# Altium footprint library Kapitoshka.PcbLib: 146 footprints (part 7 of 10)
Each footprint in its own frame and in the unit in brackets; x right, y up, seen from the top. Pads: shape width x height; smd on the part's side, far side on the other; paste and mask are expansions set on the pad; w line width, h text height; cw(c..) or ccw(c..) is an arc to the next point about the centre after c.
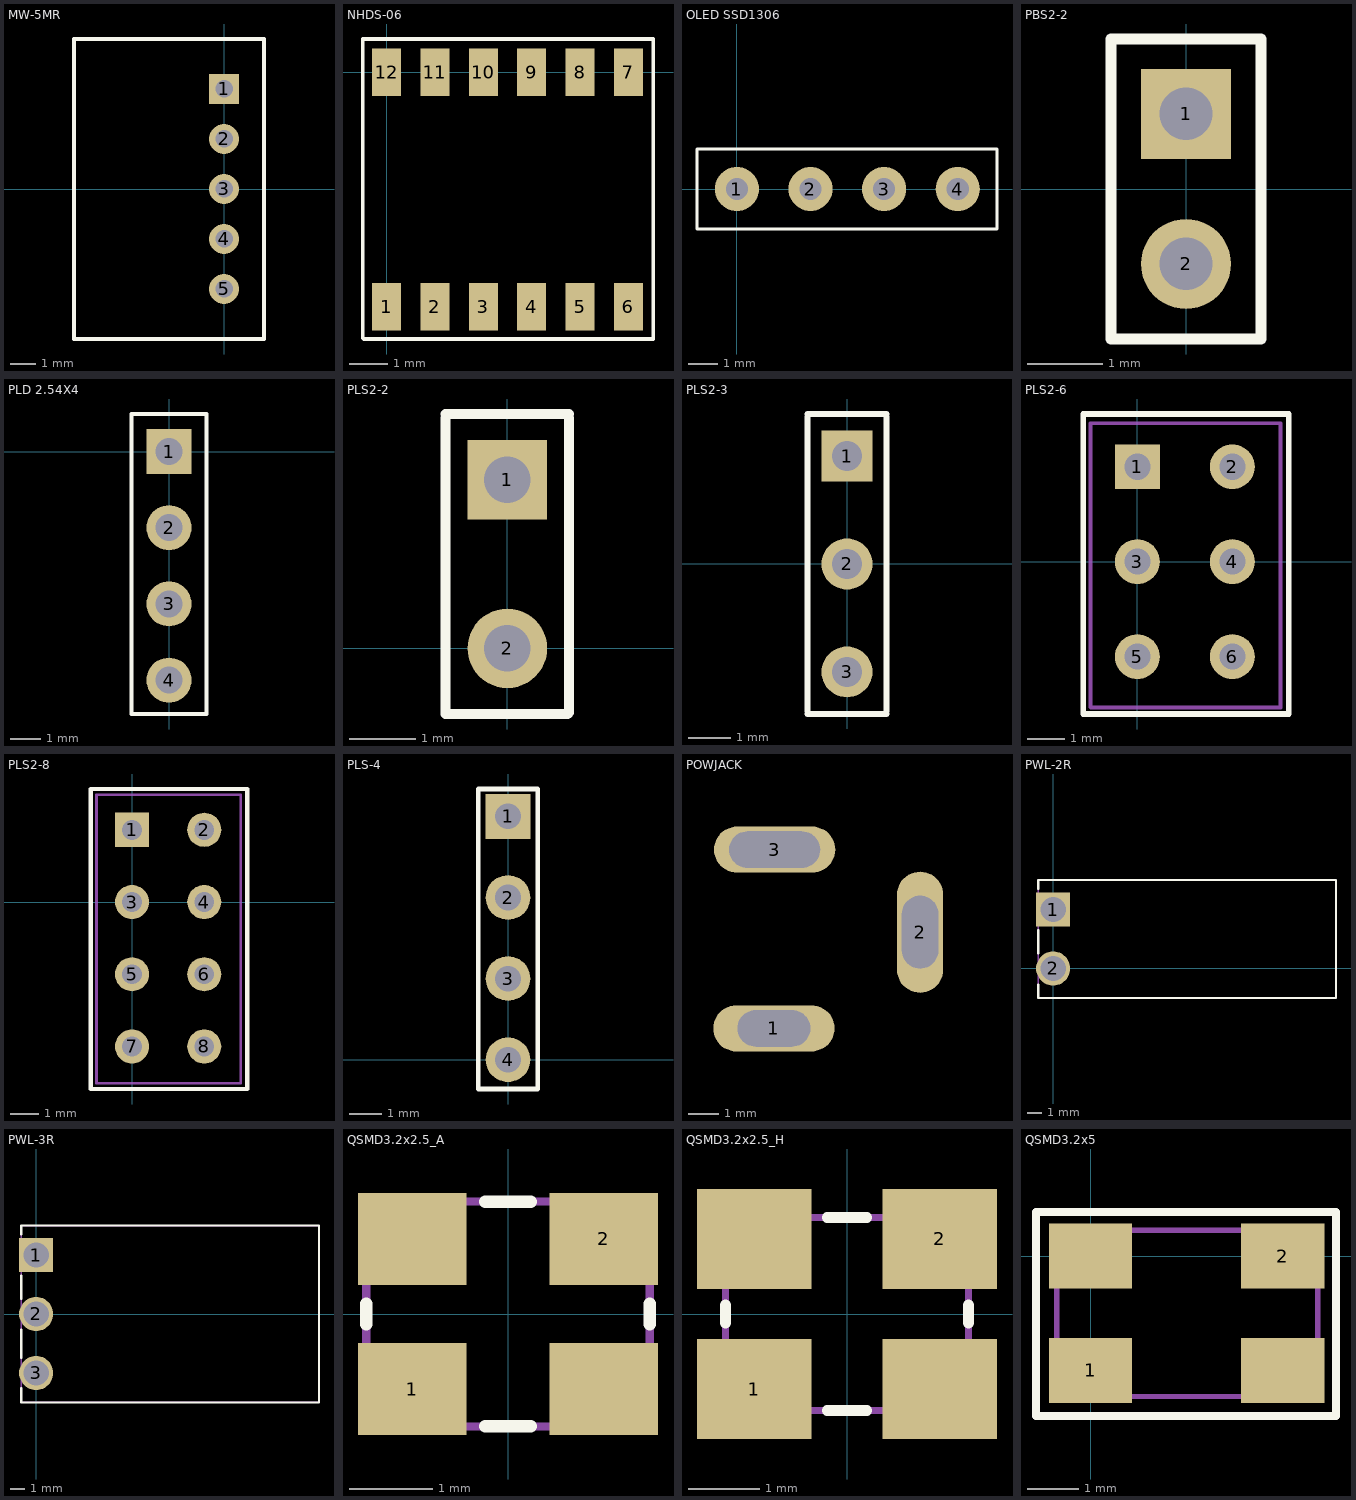
[diagram p6: the footprints below, top view; thin cyan lines are the x and y axes]

## MW-5MR [mm]
height 4.5
pads (5):
  rect 1.2x1.2 hole 0.7: 1(0,4)
  round 1.2 hole 0.7: 2(0,2) 3(0,0) 4(0,-2) 5(0,-4)
Top Overlay:
  lines w0.15: -6,-6 -6,6 1.6,6 1.6,-6 -6,-6
Mechanical 7:
  lines w0.1: -6,-6 -6,6 1.6,6 1.6,-6 -6,-6
Mechanical 10:
  text ".Comment" at -3.42,6.46 h0.6
  text ".Designator" at -3.43,7.03 h0.8
3D body "S5B-PH-K-S.STEP": height 4.8, standoff -3.4, extent -6,-5.95 1.6,5.95

## NHDS-06 [mm] "Переключатель DIP 6поз. 1.27мм"
pads (12):
  rect 0.76x1.25 smd: 1(0,-6.15) 2(1.27,-6.15) 3(2.54,-6.15) 4(3.81,-6.15) 5(5.08,-6.15) 6(6.35,-6.15) 7(6.35,0) 8(5.08,0) 9(3.81,0) 10(2.54,0) 11(1.27,0) 12(0,0)
Top Overlay:
  lines w0.1: -0.625,-6.975 -0.6,-7 7,-7 7,0.875 -0.625,0.875 -0.625,-6.975
3D body: height 1, standoff 0, extent 5.975,-6.162 6.725,-5.437
3D body: height 1, standoff 0, extent 5.975,-0.737 6.725,-0.012
3D body: height 1, standoff 0, extent -0.375,-6.162 0.375,-5.437
3D body: height 1, standoff 0, extent 0.9,-6.162 1.65,-5.437
3D body: height 1, standoff 0, extent 2.15,-6.162 2.9,-5.437
3D body: height 1, standoff 0, extent 3.425,-6.162 4.175,-5.437
3D body: height 1, standoff 0, extent 4.7,-6.137 5.45,-5.412
3D body: height 1, standoff 0, extent 4.7,-0.762 5.45,-0.037
3D body: height 1, standoff 0, extent 3.425,-0.737 4.175,-0.012
3D body: height 1, standoff 0, extent 2.15,-0.737 2.9,-0.012
3D body: height 1, standoff 0, extent 0.9,-0.762 1.65,-0.037
3D body: height 1, standoff 0, extent -0.375,-0.75 0.375,-0.025
3D body: height 1.5, standoff 0, extent -0.45,-5.425 6.825,-0.75

## OLED SSD1306 [mil] "OLED дисплей SSD1306"
pads (4):
  round 60 hole 30: 1(0,0) 2(100,0) 3(200,0) 4(300,0)
Top Overlay:
  lines w3.94: -54.13,-54.13 -54.13,-39.37 -54.13,54.13 353.35,54.13 353.35,-54.13 -54.13,-54.13
3D body "OLED_0.91_128x32.stp": height 202.36, standoff -248.82, extent -88.58,-1444.88 387.79,62.99

## PBS2-2 [mm]
height 4.5
pads (2):
  rect 1.2x1.2 hole 0.7: 1(0,1)
  round 1.2 hole 0.7: 2(0,-1)
Top Overlay:
  lines w0.15: -1,-2 1,-2 1,2 -1,2 -1,-2
Mechanical 7:
  lines w0.1: -1,-2 1,-2 1,2 -1,2 -1,-2
Mechanical 10:
  text ".Designator" at -0.575,3.15 h0.8
  text ".Comment" at -0.575,2.475 h0.6
3D body: height 4.5, standoff 0, extent -1,-2 1,2

## PLD 2.54X4 [mm]
pads (4):
  rect 1.5x1.5 hole 0.9: 1(0,0)
  round 1.5 hole 0.9: 2(0,-2.54) 3(0,-5.08) 4(0,-7.62)
Top Overlay:
  lines w0.15: -1.25,-8.75 1.25,-8.75 1.25,1.25 -1.25,1.25 -1.25,-8.75

## PLS2-2 [mm]
height 0.05
pads (2):
  rect 1.2x1.2 hole 0.7: 1(0,2.54)
  round 1.2 hole 0.7: 2(0,0)
Top Overlay:
  lines w0.15: -0.93,-0.99 0.91,-0.99 0.93,-0.97 0.93,3.47 ; -0.93,-0.975 -0.93,3.47 ; -0.93,3.53 0.93,3.53
Mechanical 7:
  lines w0.1: -0.93,-0.975 -0.93,3.47 ; -0.93,3.53 0.93,3.53 ; -0.91,-0.975 0.95,-0.975 ; 0.93,-0.975 0.93,3.47
Mechanical 10:
  text ".Comment" at -0.7,-4.1 h0.6
  text ".Designator" at -0.3,3.7 h0.8
3D body "User Library-PLS-2.step": height 8.54, standoff -3, extent -1.25,-1.265 1.29,3.815

## PLS2-3 [mm]
height 0.05
pads (3):
  rect 1.2x1.2 hole 0.7: 1(0,2.54)
  round 1.2 hole 0.7: 2(0,0) 3(0,-2.54)
Top Overlay:
  lines w0.15: -0.93,-3.53 0.93,-3.53 ; -0.93,-3.47 -0.93,3.47 ; -0.93,3.53 0.93,3.53 ; 0.93,-3.47 0.93,3.47
Mechanical 7:
  lines w0.1: -0.93,-3.53 0.93,-3.53 ; -0.93,-3.47 -0.93,3.47 ; -0.93,3.53 0.93,3.53 ; 0.93,-3.47 0.93,3.47
Mechanical 10:
  text ".Designator" at -0.3,3.7 h0.8
  text ".Comment" at -0.7,-4.1 h0.6
3D body "User Library-PLS-3.step": height 8.54, standoff -3, extent -1.24,-3.81 1.3,3.81

## PLS2-6 [mm] "Разъем для программатора ISP"
height 0.05
pads (6):
  rect 1.2x1.2 hole 0.7: 1(0,2.54)
  round 1.2 hole 0.7: 2(2.54,2.54) 3(0,0) 4(2.54,0) 5(0,-2.54) 6(2.54,-2.54)
Top Overlay:
  lines w0.15: -1.45,-4.075 -1.45,3.95 4.05,3.95 4.05,-4.075 -1.45,-4.075
Mechanical 7:
  lines w0.1: 3.8,3.7 -1.255,3.7 -1.255,-3.895 -1.25,-3.9 3.825,-3.9 3.825,3.7
Mechanical 10:
  text ".Comment" at -0.7,-4.1 h0.6
  text ".Designator" at -0.3,3.7 h0.8
3D body "User Library-PLS-3.step": height 8.54, standoff -3, extent -1.265,-3.91 1.275,3.71
3D body "User Library-PLS-3.step": height 8.54, standoff -3, extent 1.275,-3.91 3.815,3.71

## PLS2-8 [mm] "Разъем для программатора ISP"
height 0.05
pads (8):
  rect 1.2x1.2 hole 0.7: 1(0,2.54)
  round 1.2 hole 0.7: 2(2.54,2.54) 3(0,0) 4(2.54,0) 5(0,-2.54) 6(2.54,-2.54) 7(0,-5.08) 8(2.54,-5.08)
Top Overlay:
  lines w0.15: -1.45,-6.575 4.05,-6.575 4.05,3.975 -1.45,3.975 -1.45,-6.575
Mechanical 7:
  lines w0.1: -1.255,-6.375 -1.255,3.775 3.825,3.775 3.825,-6.375 -1.255,-6.375
Mechanical 10:
  text ".Comment" at -0.7,-4.1 h0.6
  text ".Designator" at -0.3,3.7 h0.8
3D body "User Library-2x4 female header 2_54mm pitch.step": height 4.5, standoff -3.15, extent -1.265,-6.375 3.815,3.785

## PLS-4 [mm]
height 0.05
pads (4):
  rect 1.4x1.4 hole 0.8: 1(0,7.62)
  round 1.4 hole 0.8: 2(0,5.08) 3(0,2.54)
  round 1.4 hole 0.8 mask+0.102: 4(0,0)
Top Overlay:
  lines w0.15: -0.93,-0.92 0.93,-0.92 0.93,8.48 -0.93,8.48 -0.93,-0.92
Mechanical 7:
  lines w0.1: -0.93,-0.92 0.93,-0.92 0.93,8.48 -0.93,8.48 -0.93,-0.92
Mechanical 10:
  text ".Designator" at 1.2,8.4 h0.8
  text ".Comment" at 1.1,-0.3 h0.6
3D body "Pin Header 1x4 TH Pitch 2.54mm.stp": height 9.5, standoff -3.2, extent -1.27,-1.27 1.27,8.89

## POWJACK [mm]
pads (3):
  oval 4x1.524 hole 1.2 slot 2.4 at 0 deg: 1(-14.825,24.775)
  oval 1.524x4 hole 1.2 slot 2.4 at 90 deg: 2(-10,27.95)
  oval 4x1.524 hole 1.2 slot 3 at 0 deg: 3(-14.8,30.675)
3D body "User_Library-ds-210.step": height 11.3, standoff -4.1, extent -19.3,16.9 -9.75,31.4

## PWL-2R [mm]
height 10.2
pads (2):
  rect 2.3x2.3 hole 1.7: 1(0,3.96)
  round 2.3 hole 1.7: 2(0,0)
Top Overlay:
  lines w0.15: -1,-1.98 19,-1.98 19,5.94 -1,5.94 -1,5.35 ; -1,-1.975 -1,-1.1 ; -1,1 -1,2.575
Mechanical 7:
  lines w0.1: -1,-1.98 19,-1.98 19,5.94 -1,5.94 -1,-1.98
Mechanical 10:
  text ".Comment" at 7.955,6.66 h0.6
  text ".Designator" at 7.945,7.23 h0.8
3D body: height 10.2, standoff 0, extent -1,-1.98 19,5.94

## PWL-3R [mm]
height 10.2
pads (3):
  rect 2.3x2.3 hole 1.7: 1(0,3.96)
  round 2.3 hole 1.7: 2(0,0) 3(0,-3.96)
Top Overlay:
  lines w0.15: -1,-4.975 -1,-5.94 19,-5.94 19,5.94 -1,5.94 -1,5.35 ; -1,-2.95 -1,-1.05 ; -1,1.025 -1,2.575
Mechanical 7:
  lines w0.1: -1,-5.94 19,-5.94 19,5.94 -1,5.94 -1,-5.94
Mechanical 10:
  text ".Designator" at 7.945,7.23 h0.8
  text ".Comment" at 7.955,6.66 h0.6
3D body: height 10.2, standoff 0, extent -1,-5.94 19,5.94

## QSMD3.2x2.5_A [mm]
height 1.2
pads (4):
  rect 1.3x1.1 smd: 1(-1.15,-0.9) 2(1.15,0.9) ""(-1.15,0.9) ""(1.15,-0.9)
Top Overlay:
  lines w0.15: -1.7,-0.125 -1.7,0.125 ; -0.275,-1.35 0.275,-1.35 ; -0.275,1.35 0.275,1.35 ; 1.7,-0.125 1.7,0.125
Mechanical 7:
  lines w0.1: -1.7,-1.35 1.7,-1.35 1.7,1.35 -1.7,1.35 -1.7,-1.35
Mechanical 10:
  text ".Comment" at -0.825,1.85 h0.6
  text ".Designator" at -0.85,2.425 h0.8
3D body: height 1.2, standoff 0, extent -1.7,-1.35 1.7,1.35

## QSMD3.2x2.5_H [mm]
height 1.2
pads (4):
  rect 1.6x1.4 smd: 1(-1.3,-1.05) 2(1.3,1.05) ""(-1.3,1.05) ""(1.3,-1.05)
Top Overlay:
  lines w0.15: -1.7,-0.125 -1.7,0.125 ; -0.275,-1.35 0.275,-1.35 ; -0.275,1.35 0.275,1.35 ; 1.7,-0.125 1.7,0.125
Mechanical 7:
  lines w0.1: -1.7,-1.35 -1.7,1.35 1.7,1.35 1.7,-1.35 -1.7,-1.35
Mechanical 10:
  text ".Designator" at -0.825,2.75 h0.8
  text ".Comment" at -0.8,2.175 h0.6
3D body: height 1.2, standoff 0, extent -1.7,-1.35 1.7,1.35

## QSMD3.2x5 [mm] "KX-9A 8MHz"
height 1.2
pads (4):
  rect 1.6x1.25 smd: 1(0,-2.2) 2(3.7,0) ""(0,0) ""(3.7,-2.2)
Top Overlay:
  lines w0.15: -1.05,-3.075 -1.05,0.85 4.725,0.85 4.725,-3.075 -1.05,-3.075
Mechanical 7:
  lines w0.1: -0.65,-2.7 -0.65,0.5 4.375,0.5 4.375,-2.7 -0.65,-2.7
Mechanical 10:
  text ".Comment" at -0.825,1.85 h0.6
  text ".Designator" at -0.85,2.425 h0.8
3D body "User Library-GeyerElectronics_KX9A.step": height 1.01, standoff 0, extent -0.65,-2.7 4.35,0.5